# Altium footprint library THU VIEN V1.PcbLib: 400 footprints (part 19 of 25)
Each footprint in its own frame and in the unit in brackets; x right, y up, seen from the top. Pads: shape width x height; smd on the part's side, far side on the other; paste and mask are expansions set on the pad; w line width, h text height; cw(c..) or ccw(c..) is an arc to the next point about the centre after c.
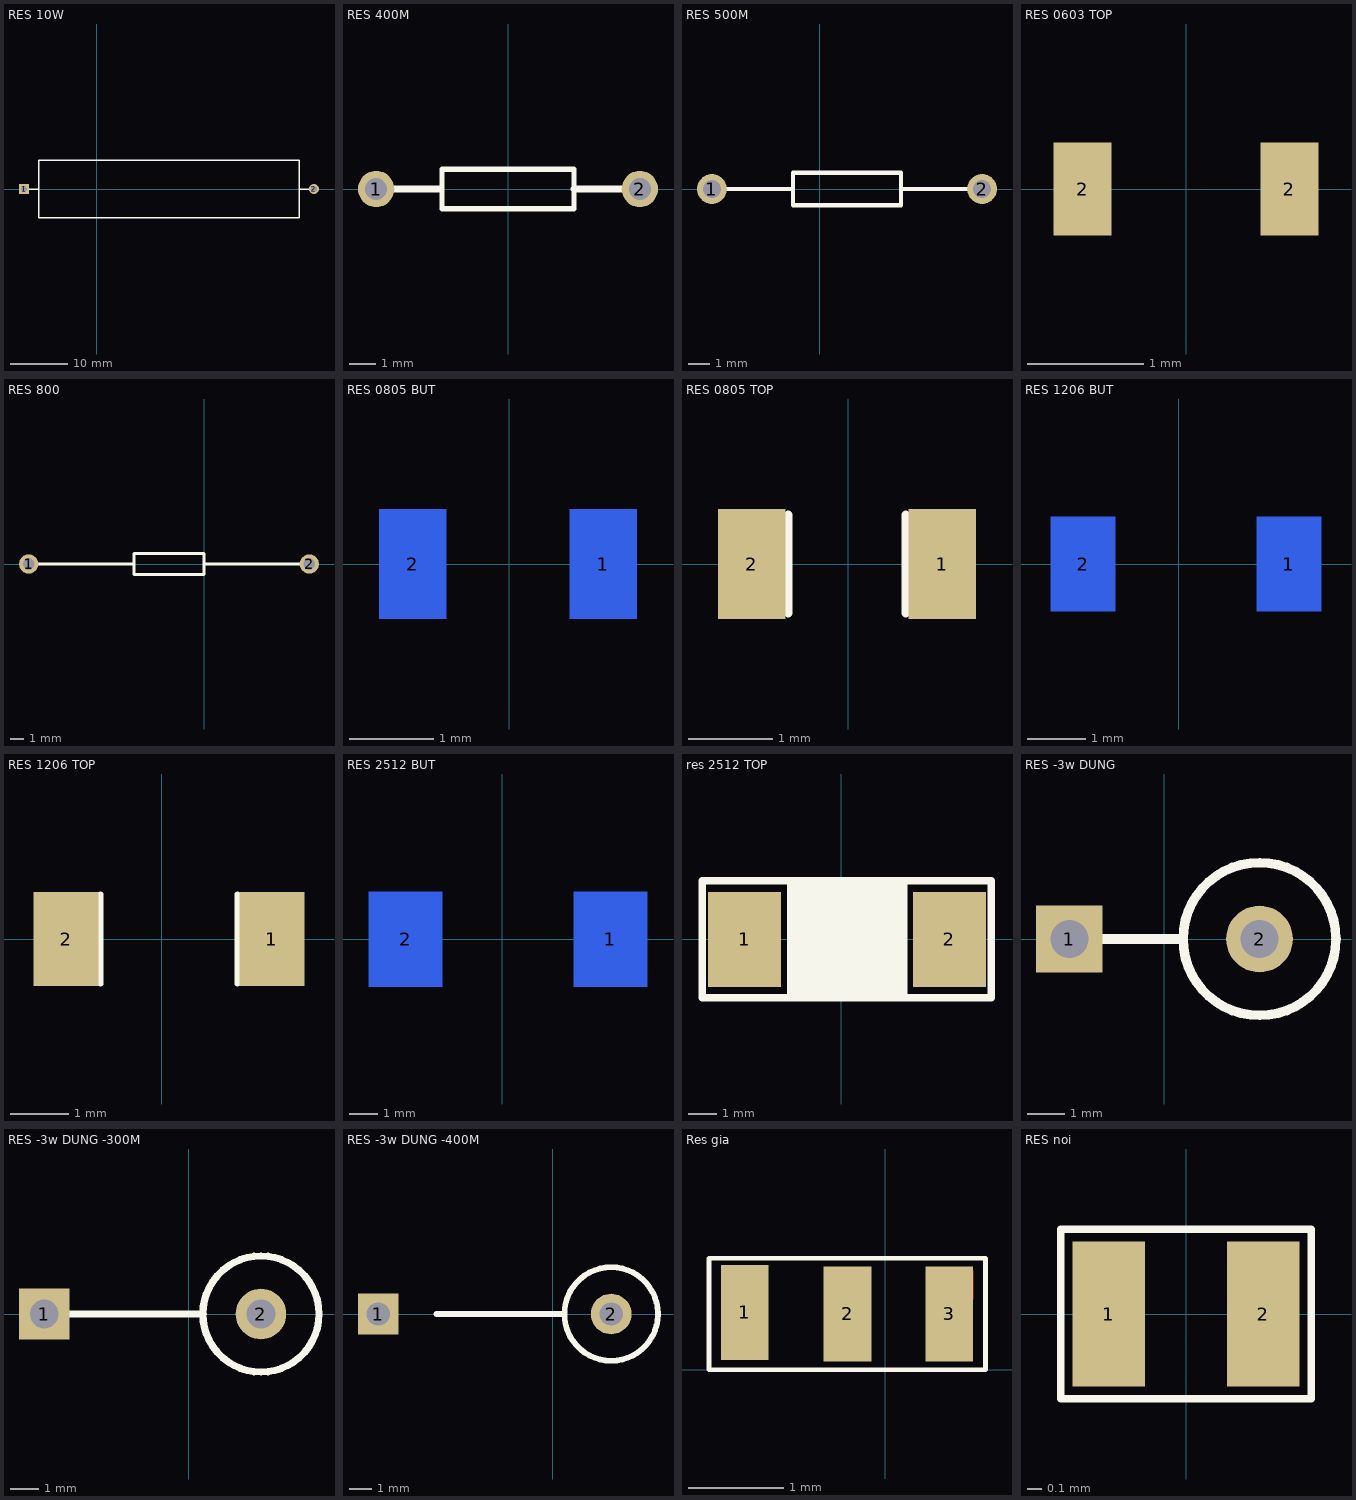
[diagram p18: the footprints below, top view; thin cyan lines are the x and y axes]

## RES 10W [mil] "Axial Device, Thru-Hole; 2 Leads; 0.3 in Pin Spacing"
height 60
pads (2):
  rect 70x70 hole 40: 1(-500,0)
  round 70 hole 40: 2(1500,0)
Top Overlay:
  lines w10: -500,0 -400,0 ; 1400,0 1500,0 ; -400,-200 -400,200 1400,200 1400,-200 -400,-200
3D body: height 271.26, standoff -169.69, extent -135.75,-135.59 1095.75,140

## RES 400M [mm] "Axial Device, Thru-Hole; 2 Leads; 0.3 in Pin Spacing"
height 1.524
pads (2):
  round 1.4 hole 0.85: 1(-5.08,0) 2(5.08,0)
Top Overlay:
  lines w0.2: -2.597,0 -2.54,0 ; 2.769,0 2.54,0 ; 2.54,0 2.54,-0.762 -2.54,-0.762 -2.54,0.762 2.54,0.762 2.54,0
  lines w0.254: -5.08,0 -2.597,0 ; 2.54,0 5.08,0
3D body: height 2.09, standoff -1.91, extent -4.05,-1 4.05,1

## RES 500M [mm] "Axial Device, Thru-Hole; 2 Leads; 0.3 in Pin Spacing"
height 1.524
pads (2):
  round 1.4 hole 0.85: 1(-5.08,0) 2(7.62,0)
Top Overlay:
  lines w0.2: -5.08,0 -1.27,0 ; 7.62,0 3.81,0 ; 3.81,0 3.81,0.762 -1.27,0.762 -1.27,-0.762 3.81,-0.762 3.81,0
3D body: height 2.09, standoff -1.91, extent -2.78,-1 5.32,1

## RES 0603 TOP [mm]
pads (2):
  rect 0.5x0.8 smd: 2(-0.889,0) 2(0.889,0)
3D body: height 0.45, standoff 0, extent -0.8,-0.41 0.8,0.41

## RES 800 [mm] "Axial Device, Thru-Hole; 2 Leads; 0.3 in Pin Spacing"
height 1.524
pads (2):
  round 1.4 hole 0.85: 1(-12.7,0) 2(7.62,0)
Top Overlay:
  lines w0.2: -12.7,0 -5.08,0 ; 7.62,0 0,0 ; 0,0 0,-0.762 -5.08,-0.762 -5.08,0.762 0,0.762 0,0
3D body: height 2.09, standoff -1.91, extent -6.59,-1 1.51,1

## RES 0805 BUT [mm]
pads (2):
  rect 0.8x1.3 smd far side: 1(1.118,0) 2(-1.143,0)
Bottom Overlay:
  lines w0.1: -0.711,-0.584 -0.711,0.584 ; 0.686,-0.584 0.686,0.584
3D body: height -0.41, standoff -0.91, extent -1,-0.625 1,0.625

## RES 0805 TOP [mm]
pads (2):
  rect 0.8x1.3 smd: 1(1.118,0) 2(-1.143,0)
Top Overlay:
  lines w0.1: -0.711,-0.584 -0.711,0.584 ; 0.686,-0.584 0.686,0.584
3D body: height 0.5, standoff 0, extent -1,-0.625 1,0.625

## RES 1206 BUT [mm]
pads (2):
  rect 1.1x1.6 smd far side: 1(1.88,0) 2(-1.626,0)
Bottom Overlay:
  lines w0.1: -1.041,-0.762 -1.041,0.762 ; 1.295,-0.762 1.295,0.762
3D body: height -0.41, standoff -0.96, extent -1.473,-0.8 1.727,0.8

## RES 1206 TOP [mm]
pads (2):
  rect 1.1x1.6 smd: 1(1.88,0) 2(-1.626,0)
Top Overlay:
  lines w0.1: -1.041,-0.762 -1.041,0.762 ; 1.295,-0.762 1.295,0.762
3D body: height 0.55, standoff 0, extent -1.473,-0.8 1.727,0.8

## RES 2512 BUT [mil]
pads (2):
  rect 100x130 smd far side: 1(148,0) 2(-132,0)
Bottom Overlay:
  rectangle: -74,-79 91,81
  lines w10: -190,-80 205,-80 205,80 -190,80 -190,-80
3D body: height -15, standoff -78.07, extent -115.99,-59.05 134,59.07

## res 2512 TOP [mil]
pads (2):
  rect 100x130 smd: 1(-132,0) 2(148,0)
Top Overlay:
  rectangle: -74,-79 91,81
  lines w10: -190,-80 205,-80 205,80 -190,80 -190,-80
3D body: height 63.07, standoff 0, extent -115.99,-59.05 134,59.06

## RES -3w DUNG [mil] "Axial Device, Thru-Hole; 2 Leads; 0.3 in Pin Spacing"
height 60
pads (2):
  rect 70x70 hole 40: 1(-100,0)
  round 70 hole 40: 2(100,0)
Top Overlay:
  circle w10: c100,0 r80.4
  lines w10: -65,0 20,0
3D body: height 738.98, standoff -261.02, extent -112.6,-82.68 182.68,82.68

## RES -3w DUNG -300M [mil] "Axial Device, Thru-Hole; 2 Leads; 0.3 in Pin Spacing"
height 60
pads (2):
  rect 70x70 hole 40: 1(-200,0)
  round 70 hole 40: 2(100,0)
Top Overlay:
  circle w10: c100,0 r80.4
  lines w10: -200,0 20,0
3D body: height 738.98, standoff -261.02, extent -112.6,-82.68 182.68,82.68

## RES -3w DUNG -400M [mil] "Axial Device, Thru-Hole; 2 Leads; 0.3 in Pin Spacing"
height 60
pads (2):
  rect 70x70 hole 40: 1(-300,0)
  round 70 hole 40: 2(100,0)
Top Overlay:
  circle w10: c100,0 r80.4
  lines w10: -200,0 20,0
3D body: height 738.98, standoff -261.02, extent -237.6,-82.68 57.68,82.68

## Res gia [mm] "Res gia 3 chan"
pads (3):
  rect 0.5x1 smd: 1(-1.475,0.6) 2(-0.397,0.584) 3(0.67,0.584)
Top Layer:
  lines w0.1: -1.675,0.775 -1.675,0.925 ; -0.2,0.75 -0.2,1 ; 0.875,0.75 0.875,1.025
Top Overlay:
  lines w0.05: -1.85,0 1.05,0 1.05,1.168 -1.85,1.168 -1.85,0

## RES noi [mm]
pads (2):
  rect 0.5x1 smd: 1(-0.533,0) 2(0.533,0)
Top Overlay:
  lines w0.05: -0.864,-0.584 -0.864,0.584 0.864,0.584 0.864,-0.584 -0.864,-0.584